# Altium footprint library phoenix.PcbLib: 55 footprints (part 3 of 4)
Each footprint in its own frame and in the unit in brackets; x right, y up, seen from the top. Pads: shape width x height; smd on the part's side, far side on the other; paste and mask are expansions set on the pad; w line width, h text height; cw(c..) or ccw(c..) is an arc to the next point about the centre after c.
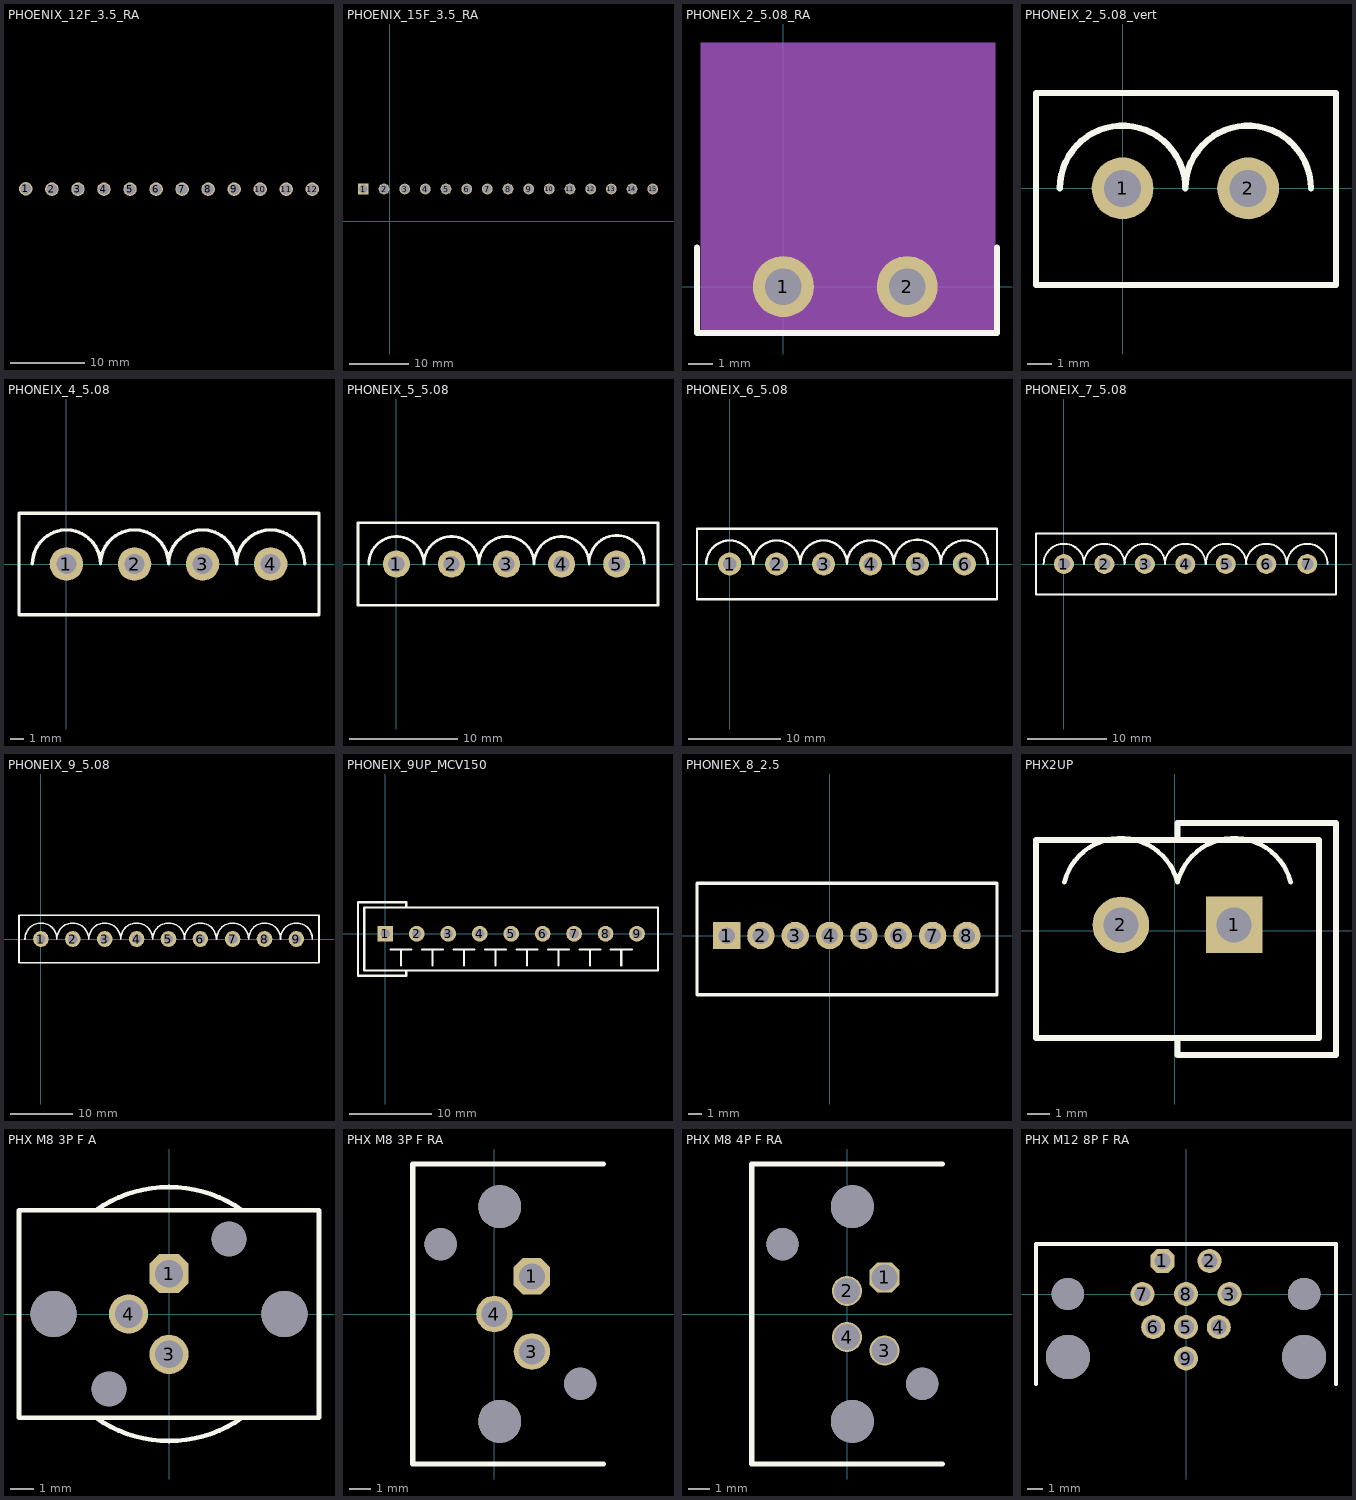
[diagram p2: the footprints below, top view; thin cyan lines are the x and y axes]

## PHOENIX_12F_3.5_RA [mm]
pads (12):
  round 1.816 hole 1.45: 1(1205.916,1233.221) 2(1209.435,1233.17) 3(1212.935,1233.17) 4(1216.435,1233.17) 5(1219.935,1233.17) 6(1223.435,1233.17) 7(1226.935,1233.17) 8(1230.435,1233.17) 9(1233.935,1233.17) 10(1237.435,1233.17) 11(1240.935,1233.17) 12(1244.435,1233.17)
3D body "1897348.stp": height 7, standoff -3.5, extent 1199.019,1231.519 1251.319,1242.219

## PHOENIX_15F_3.5_RA [mm]
pads (15):
  rect 1.816x1.816 hole 1.45: 1(-4.5,5.5)
  round 1.816 hole 1.45: 2(-1,5.5) 3(2.5,5.5) 4(6,5.5) 5(9.5,5.5) 6(13,5.5) 7(16.5,5.5) 8(20,5.5) 9(23.5,5.5) 10(27,5.5) 11(30.5,5.5) 12(34,5.5) 13(37.5,5.5) 14(41,5.5) 15(44.5,5.5)
3D body "1897377.stp": height 7.01, standoff -3.49, extent -11.4,-3.45 51.4,7.25

## PHONEIX_2_5.08_RA [mm]
height 15
pads (2):
  round 2.5 hole 1.5: 1(0,0) 2(5.08,0)
Top Overlay:
  lines w0.254: -3.54,-1.9 -3.54,1.6 ; -3.5,-1.9 8.7,-1.9 ; 8.76,-1.9 8.76,1.6
Mechanical 1:
  rectangle: -3.4,-2 8.7,10
3D body "1757242.stp": height 8.6, standoff -3.5, extent -3.54,-2.007 8.62,9.996

## PHONEIX_2_5.08_vert [mm]
height 15
pads (2):
  round 2.5 hole 1.5: 1(0,0) 2(5.08,0)
Top Overlay:
  lines w0.254: -2.54,0 cw(c0,0) 2.54,0 cw(c5.08,0) 7.62,0 ; -3.505,-3.912 8.636,-3.912 8.636,3.861 -3.505,3.861 -3.505,-3.912
3D body "1924305.stp": height 12, standoff -3.9, extent -3.515,-4.79 8.645,3.81

## PHONEIX_4_5.08 [mm] "1755752"
height 27.178
pads (4):
  round 2.5 hole 1.5: 1(0,0) 2(5.08,0) 3(10.16,0) 4(15.24,0)
Top Overlay:
  lines w0.254: -2.54,0 cw(c0,0) 2.54,0 cw(c5.08,0) 7.62,0 cw(c10.16,0) 12.7,0 cw(c15.24,0) 17.78,0 ; -3.54,-3.8 -3.54,3.8 18.847,3.8 18.847,-3.8 -3.54,-3.8
3D body "1755752.stp": height 12, standoff -3.9, extent -3.438,-4.815 18.882,3.785

## PHONEIX_5_5.08 [mm]
pads (5):
  round 2.5 hole 1.5: 1(0,0) 2(5.08,0) 3(10.16,0) 4(15.24,0) 5(20.32,0)
Top Overlay:
  lines w0.254: -2.54,0 cw(c0,0) 2.54,0 cw(c5.08,0) 7.62,0 cw(c10.16,0) 12.7,0 cw(c15.24,0) 17.78,0 ; 17.78,0.1 cw(c20.32,0.1) 22.86,0.1 ; -3.54,-3.8 -3.54,3.8 24.13,3.8 24.13,-3.8 -3.54,-3.8
3D body "1755765.stp": height 12, standoff -3.9, extent -3.524,-4.815 23.876,3.785

## PHONEIX_6_5.08 [mm]
pads (6):
  round 2.5 hole 1.5: 1(0,0) 2(5.08,0) 3(10.16,0) 4(15.24,0) 5(20.32,0) 6(25.4,0)
Top Overlay:
  lines w0.254: -2.54,0 cw(c0,0) 2.54,0 cw(c5.08,0) 7.62,0 cw(c10.16,0) 12.7,0 cw(c15.24,0) 17.78,0 ; 17.78,0.1 cw(c20.32,0.1) 22.86,0.1 ; 22.86,0 cw(c25.4,0) 27.94,0 ; -3.54,-3.8 -3.54,3.8 28.94,3.8 28.94,-3.8 -3.54,-3.8
3D body "1755778.stp": height 12, standoff -3.9, extent -3.529,-4.803 28.951,3.797

## PHONEIX_7_5.08 [mm]
pads (7):
  round 2.5 hole 1.5: 1(0,0) 2(5.08,0) 3(10.16,0) 4(15.24,0) 5(20.32,0) 6(25.4,0) 7(30.54,0)
Top Overlay:
  lines w0.254: -2.54,0 cw(c0,0) 2.54,0 ; 2.52,0 cw(c5.06,0) 7.6,0 ; 7.62,0 cw(c10.16,0) 12.7,0 cw(c15.24,0) 17.78,0 ; 17.8,0 cw(c20.34,0) 22.88,0 ; 22.86,0 cw(c25.4,0) 27.94,0 ; 28,0 cw(c30.54,0) 33.08,0 ; -3.5,-1.9 -3.5,-1.9 ; -3.5,-1.9 -3.5,-3.8 34.14,-3.8 34.14,3.8 -3.5,3.8 -3.5,1.9 ; -3.5,-1.9 -3.5,-0.95 -3.5,0.95 -3.5,1.9 ; -3.5,1.9 -3.5,1.9
3D body "1755781.stp": height 12, standoff -3.9, extent -3.56,-4.8 34,3.8

## PHONEIX_9_5.08 [mm]
pads (9):
  round 2.5 hole 1.5: 1(0,0) 2(5.08,0) 3(10.16,0) 4(15.24,0) 5(20.32,0) 6(25.4,0) 7(30.54,0) 8(35.62,0) 9(40.7,0)
Top Overlay:
  lines w0.254: -2.54,0 cw(c0,0) 2.54,0 ; 2.52,0 cw(c5.06,0) 7.6,0 ; 7.62,0 cw(c10.16,0) 12.7,0 cw(c15.24,0) 17.78,0 ; 17.8,0 cw(c20.34,0) 22.88,0 ; 22.86,0 cw(c25.4,0) 27.94,0 ; 28,0 cw(c30.54,0) 33.08,0 ; 33.1,0 cw(c35.64,0) 38.18,0 ; 38.16,0 cw(c40.7,0) 43.24,0 ; -3.5,-1.9 -3.5,-1.9 ; -3.5,-1.9 -3.5,-3.8 44.3,-3.8 44.3,-1.74 44.3,1.74 44.3,3.8 -3.5,3.8 -3.5,1.9 ; -3.5,-1.9 -3.5,-0.95 -3.5,0.95 -3.5,1.9 ; -3.5,1.9 -3.5,1.9
3D body "1755804.stp": height 12, standoff -3.9, extent -3.569,-4.803 44.151,3.797

## PHONEIX_9UP_MCV150 [mil] "9 pin Phoneix conector"
height 100
pads (9):
  rect 75x75 hole 47: 1(0,0)
  round 75 hole 47: 2(150,0) 3(300,0) 4(450,0) 5(600,0) 6(750,0) 7(900,0) 8(1050,0) 9(1200,0)
Top Overlay:
  lines w10: 25,-75 125,-75 ; 75,-150 75,-75 ; 100,-175 100,-200 -130,-200 -130,150 100,150 100,130 ; 175,-75 275,-75 ; 225,-150 225,-75 ; 325,-75 425,-75 ; 375,-150 375,-75 ; 475,-75 575,-75 ; 525,-150 525,-75 ; 625,-75 725,-75 ; 675,-150 675,-75 ; 775,-75 875,-75 ; 825,-150 825,-75 ; 925,-75 1025,-75 ; 975,-150 975,-75 ; 1075,-75 1175,-75 ; 1125,-150 1125,-75 ; -100,-175 1300,-175 1300,125 -100,125 -100,-175

## PHONIEX_8_2.5 [mm]
pads (8):
  rect 2x2 hole 1.2: 1(-7.5,0)
  round 2 hole 1.2: 2(-5,0) 3(-2.5,0) 4(0,0) 5(2.5,0) 6(5,0) 7(7.5,0) 8(10,0)
Top Overlay:
  lines w0.254: -9.652,-4.318 -9.652,3.81 12.192,3.81 12.192,-4.318 -9.652,-4.318
3D body "1881613.stp": height 10.1, standoff -3.5, extent -9.666,-4.29 12.234,3.81

## PHX2UP [mil]
pads (2):
  rect 100x100 hole 62: 1(105,10)
  round 100 hole 62: 2(-95,10)
Top Overlay:
  lines w8: -195.02,84.94 cw(c-95,60) 5.02,84.94 cw(c105,60) 205.02,84.94
  lines w10: 5,-190 5,-220 285,-220 285,190 275,190 5,190 5,160 ; -245,-190 -245,160 255,160 255,-190 -245,-190
3D body "1755736.stp": height 472.44, standoff -153.54, extent -234.37,-178.58 244.37,160

## PHX M8 3P F A [mm] "Phoenix M8 3P F A 1524776"
pads (7):
  oct 1.7x1.7 hole 1.2: 1(0,1.75)
  round 1.7 hole 1.2: 3(0,-1.75) 4(-1.75,0)
  round 2 hole 2 unplated: ""(-5,0) ""(5,0)
  round 1.5 hole 1.5 unplated: ""(-2.6,-3.25) ""(2.6,3.25)
Top Overlay:
  lines w0.203: -3.171,-4.494 ccw(c0,0) 0,-5.5 ccw(c0,0) 3.171,-4.494 ; -3.171,4.494 cw(c0,0) 0,5.5 cw(c0,0) 3.171,4.494 ; -6.5,-4.5 0,-4.5 6.5,-4.5 6.5,0 6.5,4.5 0,4.5 -6.5,4.5 -6.5,0 -6.5,-4.5
3D body "1524776.stp": height 16.51, standoff -3.74, extent -6.504,-5.5 6.503,5.5

## PHX M8 3P F RA [mm] "Phoenix M8 3P F RA 1524788"
pads (7):
  oct 1.7x1.7 hole 1.2: 1(1.75,1.75)
  round 1.7 hole 1.2: 3(1.75,-1.75) 4(0,0)
  round 1.5 hole 1.5 unplated: ""(-2.5,3.25) ""(4,-3.25)
  round 2 hole 2 unplated: ""(0.25,-5) ""(0.25,5)
Top Overlay:
  lines w0.254: 5.08,-6.985 -3.81,-6.985 -3.81,6.985 5.08,6.985
3D body "1524788.stp": height 12.02, standoff -4.48, extent -3.236,-6.574 17.264,6.625

## PHX M8 4P F RA [mm] "Phoenix M8 4P F RA 1526169"
pads (8):
  oct 1.4x1.4 hole 1.2: 1(1.75,1.7)
  round 1.4 hole 1.2: 2(0,1.075) 3(1.75,-1.7) 4(0,-1.075)
  round 1.5 hole 1.5 unplated: ""(-3,3.25) ""(3.5,-3.25)
  round 2 hole 2 unplated: ""(0.25,-5) ""(0.25,5)
Top Overlay:
  lines w0.254: 4.445,-6.985 -4.445,-6.985 -4.445,6.985 4.445,6.985
3D body "1526169.stp": height 12.02, standoff -4.49, extent -3.744,-6.503 16.756,6.505

## PHX M12 8P F RA [mm] "Phoenix M12 8P F RA 1436974"
pads (13):
  oct 1.524x1.524 hole 1: 1(-1.5,2.1)
  round 1.524 hole 1: 2(1.5,2.1) 3(2.77,0) 4(2.08,-2.1) 5(0,-2.1) 6(-2.08,-2.1) 7(-2.77,0) 8(0,0) 9(0,-4.1)
  round 2.8 hole 2.8 unplated: ""(-7.5,-4) ""(7.5,-4)
  round 2.05 hole 2.05 unplated: ""(-7.5,0) ""(7.5,0)
Top Overlay:
  lines w0.254: -9.525,-5.715 -9.525,3.175 9.525,3.175 9.525,-5.715
3D body "1436974.stp": height 16.42, standoff -3.18, extent -9.6,-23.3 9.6,3